# Altium footprint library First Board IMX6.PcbLib: 204 footprints (part 2 of 13)
Each footprint in its own frame and in the unit in brackets; x right, y up, seen from the top. Pads: shape width x height; smd on the part's side, far side on the other; paste and mask are expansions set on the pad; w line width, h text height; cw(c..) or ccw(c..) is an arc to the next point about the centre after c.
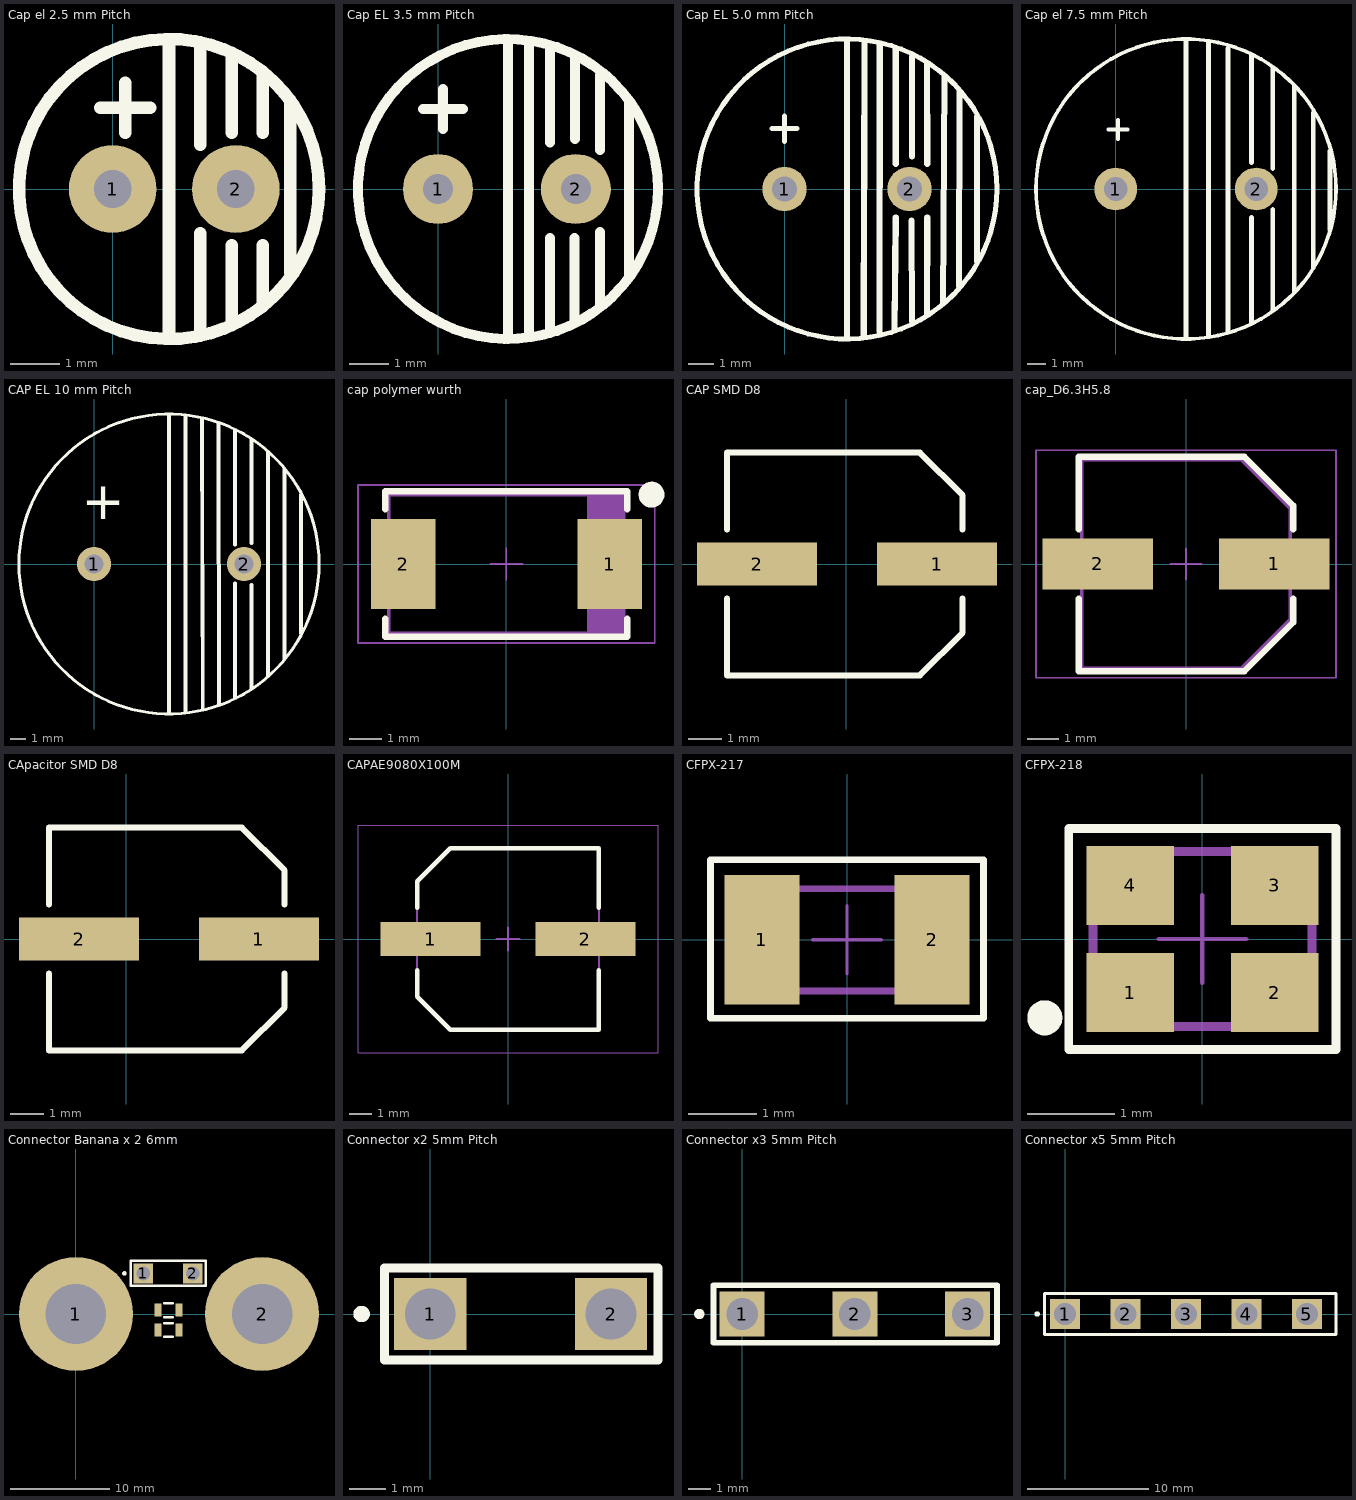
[diagram p1: the footprints below, top view; thin cyan lines are the x and y axes]

## Cap el 2.5 mm Pitch [mil]
pads (2):
  round 70 hole 30: 1(0,0) 2(98.43,0)
Top Overlay:
  circle w10: c45,0 r119.8
  lines w10: -10,65 30,65 ; 10,45 10,85 ; 45,-118.11 45,118.11 ; 70,-117.17 70,-35.43 ; 70,35.43 70,117.17 ; 95,-108.87 95,-45 ; 95,45 95,108.87 ; 120,-93.42 120,-45 ; 120,45 120,93.42 ; 141.73,-66.93 141.73,70.87
3D body "Capacitor Radial Electrolitic 250-630x1150.step": height 453.15, standoff -106.3, extent -79.01,-124.01 169.42,124.02

## Cap EL 3.5 mm Pitch [mil]
pads (2):
  round 70 hole 30: 1(0,0) 2(137.8,0)
Top Overlay:
  circle w10: c70,0 r150
  lines w10: -15,80 25,80 ; 5,60 5,100 ; 70,-150 70,-120 70,150 ; 91.06,-145 91.06,145 ; 111.97,-143.94 111.97,-48.94 ; 112.13,46.26 112.13,141.26 ; 136.46,-133.94 136.46,-48.94 ; 137.13,50.2 137.13,130.2 ; 162.13,-117.87 162.13,-42.87 ; 162.13,38.94 162.13,113.94 ; 191.06,-86.61 191.06,86.61
3D body "Capacitor Radial Electrolitic 350-800x1500.step": height 593.94, standoff -103.3, extent -87.48,-157.47 227.88,157.49

## Cap EL 5.0 mm Pitch [mil]
pads (2):
  round 70 hole 40: 1(0,0) 2(196.85,0)
Top Overlay:
  circle w7.87: c98.43,0 r236.22
  lines w7.87: -20,95 20,95 ; 0,75 0,115
  lines w10: 98.43,-232.28 98.43,232.28 ; 124.9,-232.28 125.98,232.28 ; 149.61,-224.41 150.04,228.35 ; 173.23,-220.47 175,-45 ; 175,40 175,220.47 ; 200,-50 200.79,-208.66 ; 200.79,51.18 200.79,208.66 ; 224.41,-196.85 225,-45 ; 224.41,196.85 225,40 ; 249.6,-179.99 251.97,177.17 ; 274.83,-153.54 275.59,153.54 ; 303.15,-114.17 303.15,114.17
3D body "Capacitor Radial Electrolitic 500-1000x2000.step": height 86.3, standoff -807.8, extent -101.84,-196.84 292.25,196.86

## Cap el 7.5 mm Pitch [mil]
pads (2):
  round 90 hole 50: 1(0,0) 2(295.28,0)
Top Overlay:
  circle w7.87: c147.64,0 r315
  lines w7.87: -15,125 25,125 ; 5,105 5,145
  lines w10: 147.64,-310 147.64,310 ; 195,-310 195,310 ; 236.06,-300 236.06,295 ; 285,-280 285,-60 ; 285,55 285,280 ; 330,-255 330,-43.31 ; 330,43.31 330,255 ; 375,-215 375,215 ; 415,-165 415,160 ; 450,-85 450,80
3D body "Capacitor Radial Electrolitic 750-1600x3000.step": height 1181.5, standoff -106.3, extent -164.95,-314.95 465.36,314.97

## CAP EL 10 mm Pitch [mil]
pads (2):
  round 90 hole 50: 1(0,0) 2(393.7,0)
Top Overlay:
  circle w7.87: c196.85,0 r393.7
  lines w10: 196.85,-389.76 196.85,389.76 ; 240.16,389.76 240.29,-385.83 ; 283.46,381.89 285.48,-381.88 ; 326.77,366.14 327.82,-366.14 ; 370.08,-350.39 370.08,-51.18 ; 370.08,51.18 370.08,350.39 ; 413.39,-326.77 413.39,-55.12 ; 413.39,55.12 413.39,326.77 ; 456.69,-291.34 456.69,291.34 ; 500,-248.03 500,248.03 ; 543.31,-181.1 543.31,181.1
  text "+" at -31.5,117.46 h98.43
3D body "Electrolytic radial capacitor 10mm pitch.step": height 1989.37, standoff -39.37, extent -240.16,-433.07 627.17,433.07

## cap polymer wurth [mm]
pads (2):
  rect 2x2.8 smd: 1(3.2,0) 2(-3.2,0)
Top Overlay:
  circle w0.4: c4.5,2.15 r0.2
  lines w0.2: -3.75,-1.7 -3.75,-2.25 3.75,-2.25 3.75,-1.7 ; -3.75,1.7 -3.75,2.25 3.75,2.25 3.75,1.7
Top Assembly:
  rectangle: 2.5,-2.15 3.65,2.15
  lines w0.1: -3.65,-2.15 3.65,-2.15 3.65,2.15 -3.65,2.15 -3.65,-2.15
  text ".Designator" at -1.248,-0.25 h1.5
Top Courtyard:
  lines w0.05: -0.5,0 0.5,0 ; 0,-0.5 0,0.5 ; -4.6,-2.45 -4.6,2.45 4.6,2.45 4.6,-2.45 -4.6,-2.45
Top 3D Body:
  rectangle: 2.5,-2.15 3.65,2.15
  lines w0.1: -3.65,-2.15 3.65,-2.15 3.65,2.15 -3.65,2.15 -3.65,-2.15
3D body "WCAP-PHGP_7,3x4,3x1,9.stp": height 1.9, standoff 0, extent -3.65,-2.15 3.65,2.15

## CAP SMD D8 [mil]
pads (2):
  rect 140x50 smd: 1(105.79,0) 2(-104.21,0)
Top Overlay:
  lines w7: -139.21,-40 -139.21,-130 85.79,-130 135.79,-80 135.79,-40 ; -139.21,40 -139.21,130 75.79,130 85.79,130 135.79,80 135.79,40
3D body "capacitor SMD D8.step": height 306.35, standoff 2.8, extent -137.01,-129.92 138.58,129.92

## cap_D6.3H5.8 [mm] "Aluminum Polymer Capacitors, body diameter 6.3mm"
height 5.8
pads (2):
  rect 3.5x1.6 smd: 1(2.8,0) 2(-2.8,0)
Top Overlay:
  lines w0.2: -3.4,-1.1 -3.4,-3.4 1.85,-3.4 3.4,-1.85 3.4,-1.1 ; -3.4,1.1 -3.4,3.4 1.85,3.4 3.4,1.85 3.4,1.1
Mechanical 11:
  lines w0.1: -3.3,-3.3 -3.3,3.3 1.75,3.3 3.3,1.75 3.3,-1.75 1.75,-3.3 -3.3,-3.3
  text ".Designator" at -2.5,-0.75 h1.5
Mechanical 15:
  lines w0.05: -0.5,0 0.5,0 ; 0,-0.5 0,0.5 ; -4.75,-3.6 -4.75,3.6 4.75,3.6 4.75,-3.6 -4.75,-3.6
3D body "6.3x5.8x2.2.stp": height 5.8, standoff 0, extent -3.65,-3.3 3.65,3.3

## CApacitor SMD D8 [mil]
pads (2):
  rect 140x50 smd: 1(155,0) 2(-55,0)
Top Overlay:
  lines w7: -90,-40 -90,-130 135,-130 185,-80 185,-40 ; -90,40 -90,130 125,130 135,130 185,80 185,40
3D body "capacitor SMD D8.step": height 306.35, standoff 2.8, extent -87.8,-129.92 187.79,129.92

## CAPAE9080X100M [mm] "Aluminum Electrolytic Capacitor, Body 8,00x8,00x10,00mm, IPC Low Density"
height 10
pads (2):
  rect 4.4x1.5 smd: 1(-3.4,0) 2(3.4,0)
Top Overlay:
  lines w0.2: -4,-1.375 -4,-2.538 -2.538,-4 4,-4 4,-1.375 ; -4,1.375 -4,2.537 -2.538,4 4,4 4,1.375
Mechanical 13:
  lines w0.1: -4,-2.538 -2.538,-4 4,-4 4,4 -2.538,4 -4,2.537 -4,-2.538
Mechanical 15:
  lines w0.05: -6.6,-5 -6.6,5 6.6,5 6.6,-5 -6.6,-5
  lines w0.1: -0.5,0 0.5,0 ; 0,-0.5 0,0.5
3D body: height 3.34, standoff 0, extent -4,-4 4,4
3D body: height 10, standoff 0, extent -4,-4 4,3.994

## CFPX-217 [mm]
pads (2):
  rect 1.1x1.9 smd: 1(-1.25,0) 2(1.25,0)
Top Overlay:
  lines w0.1: -2,-1.15 -2,1.175 2,1.175 2,-1.15 -2,-1.15
Mechanical 11:
  lines w0.1: -1.6,-0.75 1.6,-0.75 1.6,0.75 -1.6,0.75 -1.6,-0.75
  text ".Designator" at -1.15,-0.475 h1
Mechanical 13:
  lines w0.1: -1.6,-0.75 -1.6,0.75 1.6,0.75 1.6,-0.75 -1.6,-0.75
Mechanical 15:
  lines w0.05: -0.5,0 0.5,0 ; 0,-0.5 0,0.5 ; -2,-1.15 -2,1.15 2,1.15 2,-1.15 -2,-1.15
3D body "FrqXTAL_CFPX-217.stp": height 0.75, standoff 0, extent -1.6,-0.75 1.6,0.75

## CFPX-218 [mm]
pads (4):
  rect 1x0.9 smd: 1(-0.825,-0.613) 2(0.825,-0.613) 3(0.825,0.613) 4(-0.825,0.613)
Top Overlay:
  circle w0.2: c-1.8,-0.9 r0.1
  lines w0.1: -1.525,-1.262 1.525,-1.262 1.525,1.262 -1.525,1.262 -1.525,-1.262
Mechanical 11:
  lines w0.1: -1.25,-1 1.25,-1 1.25,1 -1.25,1 -1.25,-1
  text ".Designator" at -0.825,-0.35 h0.7
Mechanical 13:
  lines w0.1: -1.25,-1 -1.25,1 1.25,1 1.25,-1 -1.25,-1
Mechanical 15:
  lines w0.05: -0.5,0 0.5,0 ; 0,-0.5 0,0.5 ; -1.525,-1.262 -1.525,1.262 1.525,1.262 1.525,-1.262 -1.525,-1.262
3D body "FrqXTAL_CFPX-218.stp": height 0.55, standoff 0, extent -1.25,-1 1.25,1

## Connector Banana x 2 6mm [mm]
pads (8):
  round 11.5 hole 6.1: 1(0,0) 2(18.8,0)
  rect 2x2 hole 1.4: 1(6.8,4.1) 2(11.8,4.1)
  rect 0.7x1.3 smd: 1(8.3,-1.61) 1(8.3,0.39) 2(10.4,-1.61) 2(10.4,0.39)
Top Overlay:
  circle w0.254: c4.9,4.1 r0.1
  lines w0.254: 8.919,-2.31 9.8,-2.31 ; 8.919,-0.91 9.8,-0.91 ; 8.919,-0.31 9.8,-0.31 ; 8.919,1.09 9.8,1.09 ; 5.53,2.83 5.53,5.37 13.1,5.37 13.1,2.83 5.53,2.83
3D body "CAPACITOR 0805.step": height 0.63, standoff 0.03, extent 8.3,-0.225 10.3,1.025
3D body "CAPACITOR 0805.step": height 0.63, standoff 0.03, extent 8.3,-2.225 10.3,-0.975

## Connector x2 5mm Pitch [mm]
pads (2):
  rect 2x2 hole 1.4: 1(0,0) 2(5,0)
Top Overlay:
  circle w0.254: c-1.9,0 r0.1
  lines w0.254: -1.27,-1.27 -1.27,1.27 6.3,1.27 6.3,-1.27 -1.27,-1.27

## Connector x3 5mm Pitch [mm]
pads (3):
  rect 2x2 hole 1.4: 1(0,0) 2(5,0) 3(10,0)
Top Overlay:
  circle w0.254: c-1.9,0 r0.1
  lines w0.254: -1.27,-1.27 -1.27,1.27 11.3,1.27 11.3,-1.27 -1.27,-1.27

## Connector x5 5mm Pitch [mm]
pads (5):
  rect 2.5x2.5 hole 1.8: 1(0,0) 2(5,0) 3(10,0) 4(15,0) 5(20,0)
Top Overlay:
  circle w0.254: c-2.3,0 r0.1
  lines w0.254: -1.7,-1.7 -1.7,1.7 22.4,1.7 22.4,-1.7 -1.7,-1.7